# Altium footprint library MainFPs.PcbLib: 206 footprints (part 4 of 13)
Each footprint in its own frame and in the unit in brackets; x right, y up, seen from the top. Pads: shape width x height; smd on the part's side, far side on the other; paste and mask are expansions set on the pad; w line width, h text height; cw(c..) or ccw(c..) is an arc to the next point about the centre after c.
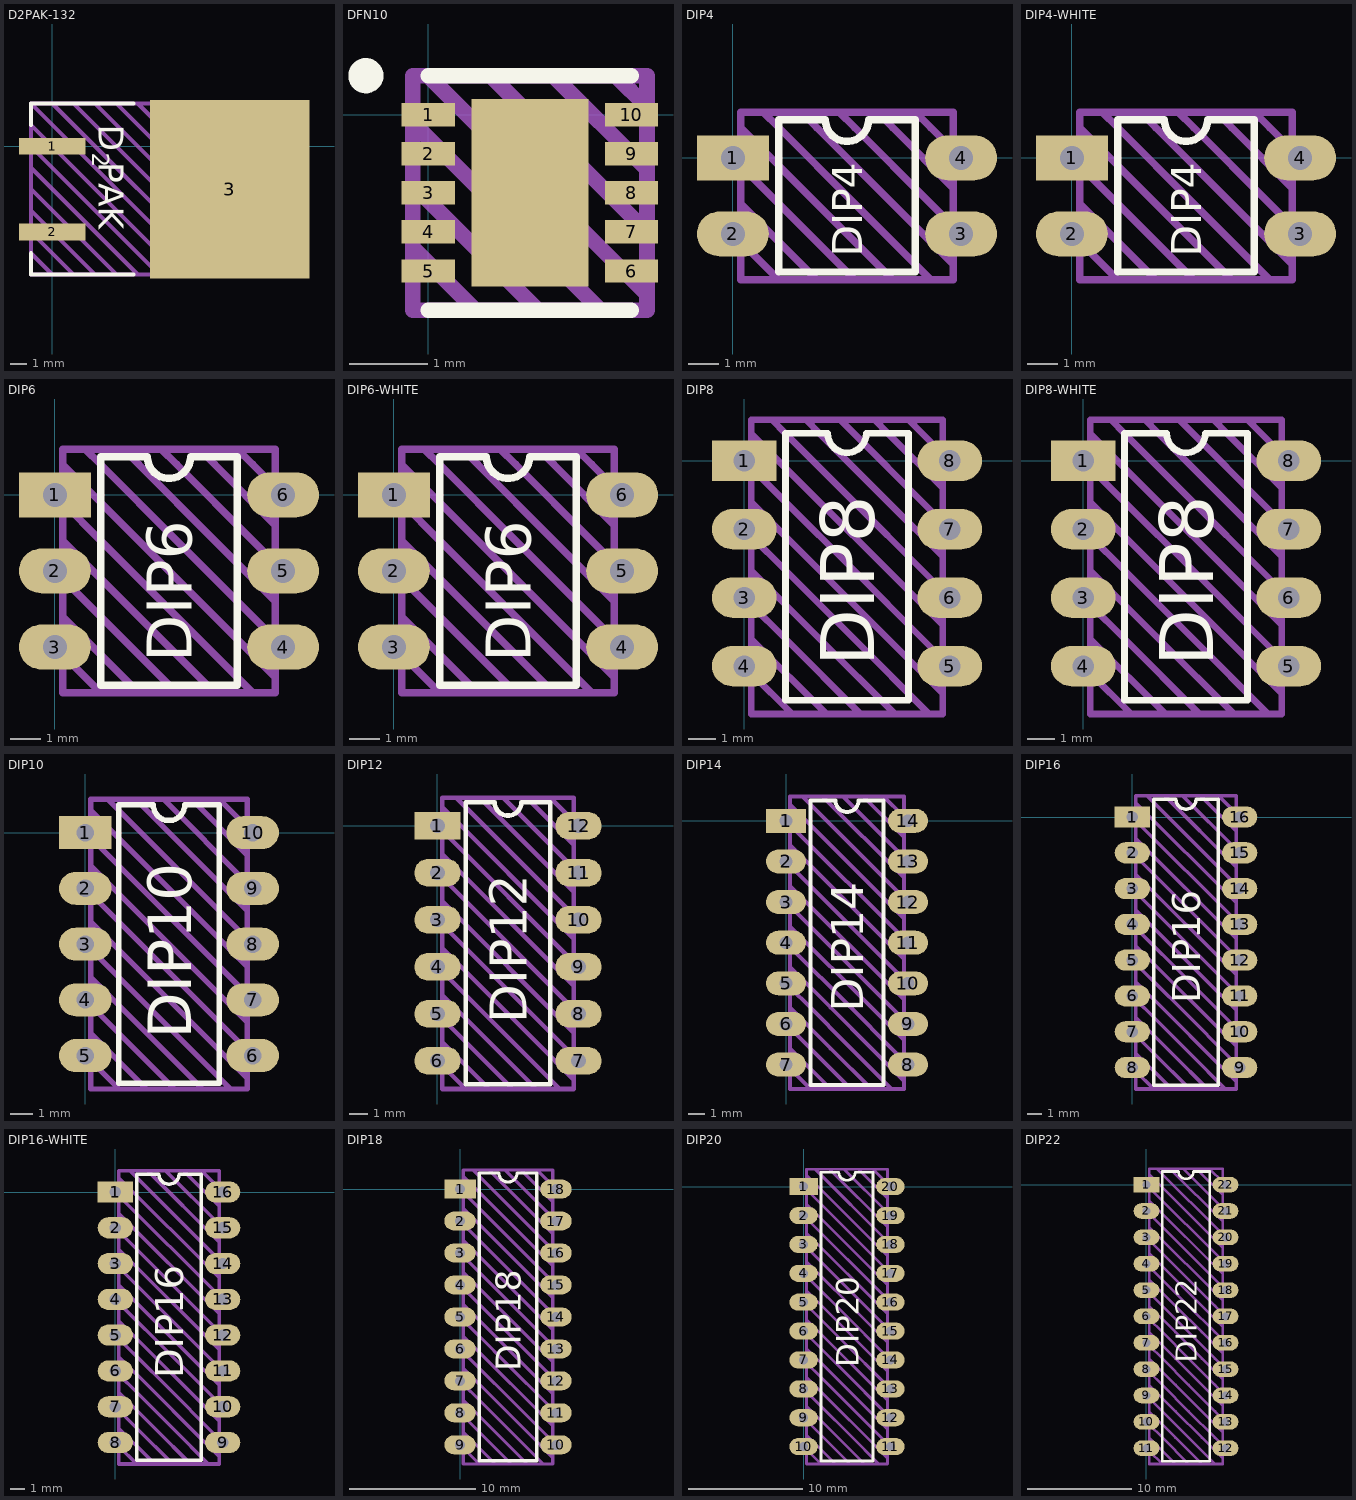
[diagram p3: the footprints below, top view; thin cyan lines are the x and y axes]

## D2PAK-132 [mm]
height 4.6
pads (3):
  rect 3.95x1 smd: 1(0,0) 2(0,-5.08)
  rect 9.5x10.6 smd: 3(10.541,-2.54)
Top Overlay:
  lines w0.25: -1.27,-6.35 -1.27,-7.62 4.826,-7.62 ; -1.27,1.27 -1.27,2.54 4.826,2.54
  text "D PAK" at 2.762,1.27 h1.5
  text "2" at 2.379,-0.383 h1
Draw:
  lines w0.25: -1.27,-6.35 0,-7.62 ; -1.27,-5.08 1.27,-7.62 ; -1.27,-3.81 2.54,-7.62 ; -1.27,-2.54 3.81,-7.62 ; -1.27,-1.27 5.08,-7.62 ; -1.27,0 6.35,-7.62 ; -1.27,1.27 7.62,-7.62 ; 0,2.54 10.16,-7.62 ; 1.27,2.54 11.43,-7.62 ; 2.54,2.54 12.7,-7.62 ; 3.81,2.54 13.97,-7.62 ; 5.08,2.54 14.097,-6.477 ; 6.35,2.54 14.097,-5.207 ; 7.62,2.54 14.097,-3.937 ; 8.89,-7.62 -1.27,2.54 ; 8.89,2.54 14.097,-2.667 ; 10.16,2.54 14.097,-1.397 ; 11.43,2.54 14.097,-0.127 ; 12.7,2.54 14.097,1.143 ; -1.27,2.54 -1.27,-7.62 14.097,-7.62 14.097,2.54 -1.27,2.54
Info:
  text "'.Comment'" at 1.297,-9.869 h1.25
3D body "D2PAK.step": height 4.7, standoff 0, extent -1.329,-7.69 14.096,2.61

## DFN10 [mm]
pads (11):
  rect 0.68x0.3 smd: 1(0,0) 2(0,-0.5) 3(0,-1) 4(0,-1.5) 5(0,-2) 6(2.6,-2) 7(2.6,-1.5) 8(2.6,-1) 9(2.6,-0.5) 10(2.6,0)
  rect 1.5x2.4 smd: ""(1.3,-1)
Top Overlay:
  circle w0.25: c-0.8,0.5 r0.1
  lines w0.2: 0,-2.5 2.6,-2.5 ; 0,0.5 2.6,0.5
Draw:
  lines w0.2: -0.2,-1.7 0.6,-2.5 ; -0.2,-0.9 1.4,-2.5 ; -0.2,-0.1 2.2,-2.5 ; 0,0.5 2.8,-2.3 ; 0.8,0.5 2.8,-1.5 ; 1.6,0.5 2.8,-0.7 ; 2.4,0.5 2.8,0.1 ; -0.2,-2.5 2.8,-2.5 2.8,0.5 -0.2,0.5 -0.2,-2.5
Info:
  text "'.Comment'" at -0.824,-3.292 h0.5
3D body "PSON50P300X100_HS-11N.step": height 1, standoff 0, extent -0.201,-2.5 2.801,0.5

## DIP4 [mm]
pads (4):
  rect 2.4x1.5 hole 0.8: 1(0,0)
  oval 2.4x1.5 hole 0.8: 2(0,-2.54) 3(7.62,-2.54) 4(7.62,0)
Top Overlay:
  lines w0.25: 3.048,1.27 1.524,1.27 1.524,-3.81 6.096,-3.81 6.096,1.27 4.572,1.27 ; 3.092,1.27 ccw(c3.81,1.27) 4.528,1.27
  text "DIP4" at 4.318,-3.302 h1
Draw:
  lines w0.25: 0.254,-2.794 1.524,-4.064 ; 0.254,-1.524 2.794,-4.064 ; 0.254,-0.254 1.524,-1.524 4.064,-4.064 ; 0.254,1.016 2.794,-1.524 5.334,-4.064 ; 3.556,1.524 4.064,1.016 6.604,-1.524 7.366,-2.286 ; 4.826,1.524 5.334,1.016 7.366,-1.016 ; 6.096,1.524 6.604,1.016 7.366,0.254 ; 6.604,-4.064 4.064,-1.524 1.524,1.016 1.016,1.524 2.286,1.524 2.794,1.016 5.334,-1.524 7.366,-3.556 ; 0.254,-4.064 0.254,1.524 7.366,1.524 7.366,-4.064 0.254,-4.064
Info:
  text "'.Comment'" at -0.381,-5.461 h1
3D body: height 2, standoff 0.25, extent 0.508,-3.81 7.112,1.27
3D body: height 3, standoff 2, extent 0.508,-3.81 7.112,1.27
3D body: height 2.09, standoff 0.31, extent -0.127,-0.5 0.508,0.5
3D body: height 0.38, standoff -3, extent -0.127,-0.254 0.127,0.254
3D body: height 2.09, standoff 0.31, extent -0.127,-3.04 0.508,-2.04
3D body: height 0.38, standoff -3, extent -0.127,-2.794 0.127,-2.286
3D body: height 2.09, standoff 0.31, extent 7.112,-3.04 7.747,-2.04
3D body: height 0.38, standoff -3, extent 7.493,-2.794 7.747,-2.286
3D body: height 2.09, standoff 0.31, extent 7.112,-0.5 7.747,0.5
3D body: height 0.38, standoff -3, extent 7.493,-0.254 7.747,0.254

## DIP4-WHITE [mm]
pads (4):
  rect 2.4x1.5 hole 0.8: 1(0,0)
  oval 2.4x1.5 hole 0.8: 2(0,-2.54) 3(7.62,-2.54) 4(7.62,0)
Top Overlay:
  lines w0.25: 3.048,1.27 1.524,1.27 1.524,-3.81 6.096,-3.81 6.096,1.27 4.572,1.27 ; 3.092,1.27 ccw(c3.81,1.27) 4.528,1.27
  text "DIP4" at 4.318,-3.302 h1
Draw:
  lines w0.25: 0.254,-2.794 1.524,-4.064 ; 0.254,-1.524 2.794,-4.064 ; 0.254,-0.254 1.524,-1.524 4.064,-4.064 ; 0.254,1.016 2.794,-1.524 5.334,-4.064 ; 3.556,1.524 4.064,1.016 6.604,-1.524 7.366,-2.286 ; 4.826,1.524 5.334,1.016 7.366,-1.016 ; 6.096,1.524 6.604,1.016 7.366,0.254 ; 6.604,-4.064 4.064,-1.524 1.524,1.016 1.016,1.524 2.286,1.524 2.794,1.016 5.334,-1.524 7.366,-3.556 ; 0.254,-4.064 7.366,-4.064 7.366,1.524 0.254,1.524 0.254,-4.064
Info:
  text "'.Comment'" at -0.381,-5.461 h1
3D body: height 0.38, standoff -3, extent 7.493,-0.254 7.747,0.254
3D body: height 2.09, standoff 0.31, extent 7.112,-0.5 7.747,0.5
3D body: height 0.38, standoff -3, extent 7.493,-2.794 7.747,-2.286
3D body: height 2.09, standoff 0.31, extent 7.112,-3.04 7.747,-2.04
3D body: height 0.38, standoff -3, extent -0.127,-2.794 0.127,-2.286
3D body: height 2.09, standoff 0.31, extent -0.127,-3.04 0.508,-2.04
3D body: height 0.38, standoff -3, extent -0.127,-0.254 0.127,0.254
3D body: height 2.09, standoff 0.31, extent -0.127,-0.5 0.508,0.5
3D body: height 3, standoff 2, extent 0.508,-3.81 7.112,1.27
3D body: height 2, standoff 0.25, extent 0.508,-3.81 7.112,1.27

## DIP6 [mm]
pads (6):
  rect 2.4x1.5 hole 0.8: 1(0,0)
  oval 2.4x1.5 hole 0.8: 2(0,-2.54) 3(0,-5.08) 4(7.62,-5.08) 5(7.62,-2.54) 6(7.62,0)
Top Overlay:
  lines w0.25: 3.048,1.27 1.524,1.27 1.524,-6.35 6.096,-6.35 6.096,1.27 4.572,1.27 ; 3.092,1.27 ccw(c3.81,1.27) 4.528,1.27
  text "DIP6" at 4.572,-5.588 h1.5
Draw:
  lines w0.25: 0.254,-5.334 1.524,-6.604 ; 0.254,-4.064 2.794,-6.604 ; 0.254,-2.794 1.524,-4.064 4.064,-6.604 ; 0.254,-1.524 2.794,-4.064 5.334,-6.604 ; 0.254,-0.254 1.524,-1.524 4.064,-4.064 6.604,-6.604 ; 0.254,1.016 2.794,-1.524 5.334,-4.064 7.366,-6.096 ; 3.556,1.524 4.064,1.016 6.604,-1.524 7.366,-2.286 ; 4.826,1.524 5.334,1.016 7.366,-1.016 ; 6.096,1.524 6.604,1.016 7.366,0.254 ; 7.366,-4.826 6.604,-4.064 4.064,-1.524 1.524,1.016 1.016,1.524 2.286,1.524 2.794,1.016 5.334,-1.524 7.366,-3.556 ; 0.254,-6.604 7.366,-6.604 7.366,1.524 0.254,1.524 0.254,-6.604
Info:
  text "'.Comment'" at -0.381,-8.001 h1
3D body: height 0.38, standoff -3, extent 7.493,-0.254 7.747,0.254
3D body: height 2.09, standoff 0.31, extent 7.112,-0.5 7.747,0.5
3D body: height 0.38, standoff -3, extent 7.493,-2.794 7.747,-2.286
3D body: height 2.09, standoff 0.31, extent 7.112,-3.04 7.747,-2.04
3D body: height 0.38, standoff -3, extent 7.493,-5.334 7.747,-4.826
3D body: height 2.09, standoff 0.31, extent 7.112,-5.58 7.747,-4.58
3D body: height 0.38, standoff -3, extent -0.127,-5.334 0.127,-4.826
3D body: height 2.09, standoff 0.31, extent -0.127,-5.58 0.508,-4.58
3D body: height 0.38, standoff -3, extent -0.127,-2.794 0.127,-2.286
3D body: height 2.09, standoff 0.31, extent -0.127,-3.04 0.508,-2.04
3D body: height 0.38, standoff -3, extent -0.127,-0.254 0.127,0.254
3D body: height 2.09, standoff 0.31, extent -0.127,-0.5 0.508,0.5
3D body: height 3, standoff 2, extent 0.508,-6.35 7.112,1.27
3D body: height 2, standoff 0.25, extent 0.508,-6.35 7.112,1.27

## DIP6-WHITE [mm]
pads (6):
  rect 2.4x1.5 hole 0.8: 1(0,0)
  oval 2.4x1.5 hole 0.8: 2(0,-2.54) 3(0,-5.08) 4(7.62,-5.08) 5(7.62,-2.54) 6(7.62,0)
Top Overlay:
  lines w0.25: 3.048,1.27 1.524,1.27 1.524,-6.35 6.096,-6.35 6.096,1.27 4.572,1.27 ; 3.092,1.27 ccw(c3.81,1.27) 4.528,1.27
  text "DIP6" at 4.572,-5.588 h1.5
Draw:
  lines w0.25: 0.254,-5.334 1.524,-6.604 ; 0.254,-4.064 2.794,-6.604 ; 0.254,-2.794 1.524,-4.064 4.064,-6.604 ; 0.254,-1.524 2.794,-4.064 5.334,-6.604 ; 0.254,-0.254 1.524,-1.524 4.064,-4.064 6.604,-6.604 ; 0.254,1.016 2.794,-1.524 5.334,-4.064 7.366,-6.096 ; 3.556,1.524 4.064,1.016 6.604,-1.524 7.366,-2.286 ; 4.826,1.524 5.334,1.016 7.366,-1.016 ; 6.096,1.524 6.604,1.016 7.366,0.254 ; 7.366,-4.826 6.604,-4.064 4.064,-1.524 1.524,1.016 1.016,1.524 2.286,1.524 2.794,1.016 5.334,-1.524 7.366,-3.556 ; 0.254,-6.604 7.366,-6.604 7.366,1.524 0.254,1.524 0.254,-6.604
Info:
  text "'.Comment'" at -0.381,-8.001 h1
3D body: height 0.38, standoff -3, extent 7.493,-0.254 7.747,0.254
3D body: height 2.09, standoff 0.31, extent 7.112,-0.5 7.747,0.5
3D body: height 0.38, standoff -3, extent 7.493,-2.794 7.747,-2.286
3D body: height 2.09, standoff 0.31, extent 7.112,-3.04 7.747,-2.04
3D body: height 0.38, standoff -3, extent 7.493,-5.334 7.747,-4.826
3D body: height 2.09, standoff 0.31, extent 7.112,-5.58 7.747,-4.58
3D body: height 0.38, standoff -3, extent -0.127,-5.334 0.127,-4.826
3D body: height 2.09, standoff 0.31, extent -0.127,-5.58 0.508,-4.58
3D body: height 0.38, standoff -3, extent -0.127,-2.794 0.127,-2.286
3D body: height 2.09, standoff 0.31, extent -0.127,-3.04 0.508,-2.04
3D body: height 0.38, standoff -3, extent -0.127,-0.254 0.127,0.254
3D body: height 2.09, standoff 0.31, extent -0.127,-0.5 0.508,0.5
3D body: height 3, standoff 2, extent 0.508,-6.35 7.112,1.27
3D body: height 2, standoff 0.25, extent 0.508,-6.35 7.112,1.27

## DIP8 [mm]
pads (8):
  rect 2.4x1.5 hole 0.8: 1(0,0)
  oval 2.4x1.5 hole 0.8: 2(0,-2.54) 3(0,-5.08) 4(0,-7.62) 5(7.62,-7.62) 6(7.62,-5.08) 7(7.62,-2.54) 8(7.62,0)
Top Overlay:
  lines w0.25: 3.048,1.016 1.524,1.016 1.524,-8.89 6.096,-8.89 6.096,1.016 4.572,1.016 ; 3.092,1.016 ccw(c3.81,1.016) 4.528,1.016
  text "DIP8" at 4.826,-7.62 h2
Draw:
  lines w0.25: 0.254,-7.874 1.778,-9.398 ; 0.254,-6.604 3.048,-9.398 ; 0.254,-5.334 1.524,-6.604 4.318,-9.398 ; 0.254,-4.064 2.794,-6.604 5.588,-9.398 ; 0.254,-2.794 1.524,-4.064 4.064,-6.604 6.858,-9.398 ; 0.254,-1.524 2.794,-4.064 5.334,-6.604 7.366,-8.636 ; 0.254,-0.254 1.524,-1.524 4.064,-4.064 6.604,-6.604 7.366,-7.366 ; 0.254,1.016 2.794,-1.524 5.334,-4.064 7.366,-6.096 ; 1.016,1.524 1.524,1.016 4.064,-1.524 6.604,-4.064 7.366,-4.826 ; 2.286,1.524 2.794,1.016 5.334,-1.524 7.366,-3.556 ; 3.556,1.524 4.064,1.016 6.604,-1.524 7.366,-2.286 ; 4.826,1.524 5.334,1.016 7.366,-1.016 ; 6.096,1.524 6.604,1.016 7.366,0.254 ; 0.254,-9.398 0.254,1.524 7.366,1.524 7.366,-9.398 0.254,-9.398
Info:
  text "'.Comment'" at -0.381,-10.795 h1
3D body: height 2.03, standoff 0.25, extent 0.508,-8.89 7.112,1.27
3D body: height 3, standoff 2, extent 0.508,-8.89 7.112,1.27
3D body: height 0.38, standoff -3, extent 7.493,-0.254 7.747,0.254
3D body: height 2.09, standoff 0.31, extent 7.112,-0.5 7.747,0.5
3D body: height 0.38, standoff -3, extent 7.493,-2.794 7.747,-2.286
3D body: height 2.09, standoff 0.31, extent 7.112,-3.04 7.747,-2.04
3D body: height 0.38, standoff -3, extent -0.127,-2.794 0.127,-2.286
3D body: height 2.09, standoff 0.31, extent -0.127,-3.04 0.508,-2.04
3D body: height 0.38, standoff -3, extent -0.127,-0.254 0.127,0.254
3D body: height 2.09, standoff 0.31, extent -0.127,-0.5 0.508,0.5
3D body: height 0.38, standoff -3, extent 7.493,-5.334 7.747,-4.826
3D body: height 2.09, standoff 0.31, extent 7.112,-5.58 7.747,-4.58
3D body: height 0.38, standoff -3, extent 7.493,-7.874 7.747,-7.366
3D body: height 2.09, standoff 0.31, extent 7.112,-8.12 7.747,-7.12
3D body: height 0.38, standoff -3, extent -0.127,-7.874 0.127,-7.366
3D body: height 2.09, standoff 0.31, extent -0.127,-8.12 0.508,-7.12
3D body: height 0.38, standoff -3, extent -0.127,-5.334 0.127,-4.826
3D body: height 2.09, standoff 0.31, extent -0.127,-5.58 0.508,-4.58

## DIP8-WHITE [mm]
pads (8):
  rect 2.4x1.5 hole 0.8: 1(0,0)
  oval 2.4x1.5 hole 0.8: 2(0,-2.54) 3(0,-5.08) 4(0,-7.62) 5(7.62,-7.62) 6(7.62,-5.08) 7(7.62,-2.54) 8(7.62,0)
Top Overlay:
  lines w0.25: 3.048,1.016 1.524,1.016 1.524,-8.89 6.096,-8.89 6.096,1.016 4.572,1.016 ; 3.092,1.016 ccw(c3.81,1.016) 4.528,1.016
  text "DIP8" at 4.826,-7.62 h2
Draw:
  lines w0.25: 0.254,-7.874 1.778,-9.398 ; 0.254,-6.604 3.048,-9.398 ; 0.254,-5.334 1.524,-6.604 4.318,-9.398 ; 0.254,-4.064 2.794,-6.604 5.588,-9.398 ; 0.254,-2.794 1.524,-4.064 4.064,-6.604 6.858,-9.398 ; 0.254,-1.524 2.794,-4.064 5.334,-6.604 7.366,-8.636 ; 0.254,-0.254 1.524,-1.524 4.064,-4.064 6.604,-6.604 7.366,-7.366 ; 0.254,1.016 2.794,-1.524 5.334,-4.064 7.366,-6.096 ; 1.016,1.524 1.524,1.016 4.064,-1.524 6.604,-4.064 7.366,-4.826 ; 2.286,1.524 2.794,1.016 5.334,-1.524 7.366,-3.556 ; 3.556,1.524 4.064,1.016 6.604,-1.524 7.366,-2.286 ; 4.826,1.524 5.334,1.016 7.366,-1.016 ; 6.096,1.524 6.604,1.016 7.366,0.254 ; 0.254,-9.398 0.254,1.524 7.366,1.524 7.366,-9.398 0.254,-9.398
Info:
  text "'.Comment'" at -0.381,-10.795 h1
3D body: height 2.03, standoff 0.25, extent 0.508,-8.89 7.112,1.27
3D body: height 3, standoff 2, extent 0.508,-8.89 7.112,1.27
3D body: height 0.38, standoff -3, extent 7.493,-0.254 7.747,0.254
3D body: height 2.09, standoff 0.31, extent 7.112,-0.5 7.747,0.5
3D body: height 0.38, standoff -3, extent 7.493,-2.794 7.747,-2.286
3D body: height 2.09, standoff 0.31, extent 7.112,-3.04 7.747,-2.04
3D body: height 0.38, standoff -3, extent -0.127,-2.794 0.127,-2.286
3D body: height 2.09, standoff 0.31, extent -0.127,-3.04 0.508,-2.04
3D body: height 0.38, standoff -3, extent -0.127,-0.254 0.127,0.254
3D body: height 2.09, standoff 0.31, extent -0.127,-0.5 0.508,0.5
3D body: height 0.38, standoff -3, extent 7.493,-5.334 7.747,-4.826
3D body: height 2.09, standoff 0.31, extent 7.112,-5.58 7.747,-4.58
3D body: height 0.38, standoff -3, extent 7.493,-7.874 7.747,-7.366
3D body: height 2.09, standoff 0.31, extent 7.112,-8.12 7.747,-7.12
3D body: height 0.38, standoff -3, extent -0.127,-7.874 0.127,-7.366
3D body: height 2.09, standoff 0.31, extent -0.127,-8.12 0.508,-7.12
3D body: height 0.38, standoff -3, extent -0.127,-5.334 0.127,-4.826
3D body: height 2.09, standoff 0.31, extent -0.127,-5.58 0.508,-4.58

## DIP10 [mm]
pads (10):
  rect 2.4x1.5 hole 0.8: 1(0,0)
  oval 2.4x1.5 hole 0.8: 2(0,-2.54) 3(0,-5.08) 4(0,-7.62) 5(0,-10.16) 6(7.62,-10.16) 7(7.62,-7.62) 8(7.62,-5.08) 9(7.62,-2.54) 10(7.62,0)
Top Overlay:
  lines w0.25: 3.048,1.27 1.524,1.27 1.524,-11.43 6.096,-11.43 6.096,1.27 4.572,1.27 ; 3.092,1.27 ccw(c3.81,1.27) 4.528,1.27
  text "DIP10" at 4.826,-9.398 h2
Draw:
  lines w0.25: 0.254,-10.414 1.524,-11.684 ; 0.254,-9.144 2.794,-11.684 ; 0.254,-7.874 4.064,-11.684 ; 0.254,-6.604 5.334,-11.684 ; 0.254,-5.334 6.604,-11.684 ; 0.254,-4.064 7.366,-11.176 ; 0.254,-2.794 7.366,-9.906 ; 0.254,-1.524 7.366,-8.636 7.366,-7.366 0.254,-0.254 0.254,1.016 7.366,-6.096 7.366,-4.826 1.016,1.524 2.286,1.524 7.366,-3.556 7.366,-2.286 3.556,1.524 4.826,1.524 7.366,-1.016 7.366,0.254 6.096,1.524 ; 0.254,-11.684 7.366,-11.684 7.366,1.524 0.254,1.524 0.254,-11.684
Info:
  text "'.Comment'" at -0.381,-13.081 h1
3D body: height 2.09, standoff 0.31, extent -0.127,-10.66 0.508,-9.66
3D body: height 0.38, standoff -3, extent -0.127,-10.414 0.127,-9.906
3D body: height 2.09, standoff 0.31, extent 7.112,-10.66 7.747,-9.66
3D body: height 0.38, standoff -3, extent 7.493,-10.414 7.747,-9.906
3D body: height 2.09, standoff 0.31, extent -0.127,-5.58 0.508,-4.58
3D body: height 0.38, standoff -3, extent -0.127,-5.334 0.127,-4.826
3D body: height 2.09, standoff 0.31, extent -0.127,-8.12 0.508,-7.12
3D body: height 0.38, standoff -3, extent -0.127,-7.874 0.127,-7.366
3D body: height 2.09, standoff 0.31, extent 7.112,-8.12 7.747,-7.12
3D body: height 0.38, standoff -3, extent 7.493,-7.874 7.747,-7.366
3D body: height 2.09, standoff 0.31, extent 7.112,-5.58 7.747,-4.58
3D body: height 0.38, standoff -3, extent 7.493,-5.334 7.747,-4.826
3D body: height 2.09, standoff 0.31, extent -0.127,-0.5 0.508,0.5
3D body: height 0.38, standoff -3, extent -0.127,-0.254 0.127,0.254
3D body: height 2.09, standoff 0.31, extent -0.127,-3.04 0.508,-2.04
3D body: height 0.38, standoff -3, extent -0.127,-2.794 0.127,-2.286
3D body: height 2.09, standoff 0.31, extent 7.112,-3.04 7.747,-2.04
3D body: height 0.38, standoff -3, extent 7.493,-2.794 7.747,-2.286
3D body: height 2.09, standoff 0.31, extent 7.112,-0.5 7.747,0.5
3D body: height 0.38, standoff -3, extent 7.493,-0.254 7.747,0.254
3D body: height 3, standoff 2, extent 0.508,-11.43 7.112,1.27
3D body: height 2.03, standoff 0.25, extent 0.508,-11.43 7.112,1.27

## DIP12 [mm]
pads (12):
  rect 2.5x1.5 hole 0.8: 1(0,0)
  oval 2.5x1.5 hole 0.8: 2(0,-2.54) 3(0,-5.08) 4(0,-7.62) 5(0,-10.16) 6(0,-12.7) 7(7.62,-12.7) 8(7.62,-10.16) 9(7.62,-7.62) 10(7.62,-5.08) 11(7.62,-2.54) 12(7.62,0)
Top Overlay:
  lines w0.25: 3.048,1.27 1.524,1.27 1.524,-13.97 6.096,-13.97 6.096,1.27 4.572,1.27 ; 3.092,1.27 ccw(c3.81,1.27) 4.528,1.27
  text "DIP12" at 4.826,-10.668 h2
Draw:
  lines w0.25: 0.254,-12.954 1.524,-14.224 ; 0.254,-11.684 2.794,-14.224 4.064,-14.224 ; 0.254,-10.414 1.524,-11.684 ; 0.254,-9.144 2.794,-11.684 ; 0.254,-7.874 4.064,-11.684 6.604,-14.224 5.334,-14.224 ; 0.254,-6.604 5.334,-11.684 7.366,-13.716 ; 0.254,-5.334 6.604,-11.684 7.366,-12.446 ; 0.254,-4.064 7.366,-11.176 ; 0.254,-2.794 7.366,-9.906 ; 0.254,-1.524 7.366,-8.636 ; 0.254,-0.254 7.366,-7.366 ; 0.254,1.016 7.366,-6.096 ; 1.016,1.524 7.366,-4.826 ; 2.286,1.524 7.366,-3.556 ; 3.556,1.524 7.366,-2.286 ; 4.826,1.524 7.366,-1.016 ; 6.096,1.524 7.366,0.254 ; 2.794,-11.684 5.334,-14.224 ; 2.794,-11.684 5.334,-14.224 ; 4.064,-14.224 1.27,-11.43 4.064,-14.224 ; 4.064,-14.224 5.334,-14.224 ; 0.254,-14.224 7.366,-14.224 7.366,1.524 0.254,1.524 0.254,-14.224
Info:
  text "'.Comment'" at -0.381,-15.621 h1
3D body: height 2.09, standoff 0.31, extent -0.127,-10.66 0.508,-9.66
3D body: height 0.38, standoff -3, extent -0.127,-10.414 0.127,-9.906
3D body: height 2.09, standoff 0.31, extent -0.127,-13.2 0.508,-12.2
3D body: height 0.38, standoff -3, extent -0.127,-12.954 0.127,-12.446
3D body: height 2.09, standoff 0.31, extent 7.112,-13.2 7.747,-12.2
3D body: height 0.38, standoff -3, extent 7.493,-12.954 7.747,-12.446
3D body: height 2.09, standoff 0.31, extent 7.112,-10.66 7.747,-9.66
3D body: height 0.38, standoff -3, extent 7.493,-10.414 7.747,-9.906
3D body: height 2.09, standoff 0.31, extent -0.127,-5.58 0.508,-4.58
3D body: height 0.38, standoff -3, extent -0.127,-5.334 0.127,-4.826
3D body: height 2.09, standoff 0.31, extent -0.127,-8.12 0.508,-7.12
3D body: height 0.38, standoff -3, extent -0.127,-7.874 0.127,-7.366
3D body: height 2.09, standoff 0.31, extent 7.112,-8.12 7.747,-7.12
3D body: height 0.38, standoff -3, extent 7.493,-7.874 7.747,-7.366
3D body: height 2.09, standoff 0.31, extent 7.112,-5.58 7.747,-4.58
3D body: height 0.38, standoff -3, extent 7.493,-5.334 7.747,-4.826
3D body: height 2.09, standoff 0.31, extent -0.127,-0.5 0.508,0.5
3D body: height 0.38, standoff -3, extent -0.127,-0.254 0.127,0.254
3D body: height 2.09, standoff 0.31, extent -0.127,-3.04 0.508,-2.04
3D body: height 0.38, standoff -3, extent -0.127,-2.794 0.127,-2.286
3D body: height 2.09, standoff 0.31, extent 7.112,-3.04 7.747,-2.04
3D body: height 0.38, standoff -3, extent 7.493,-2.794 7.747,-2.286
3D body: height 2.09, standoff 0.31, extent 7.112,-0.5 7.747,0.5
3D body: height 0.38, standoff -3, extent 7.493,-0.254 7.747,0.254
3D body: height 3, standoff 2, extent 0.508,-13.97 7.112,1.27
3D body: height 2.03, standoff 0.25, extent 0.508,-13.97 7.112,1.27

## DIP14 [mm]
pads (14):
  rect 2.5x1.5 hole 0.8: 1(0,0)
  oval 2.5x1.5 hole 0.8: 2(0,-2.54) 3(0,-5.08) 4(0,-7.62) 5(0,-10.16) 6(0,-12.7) 7(0,-15.24) 8(7.62,-15.24) 9(7.62,-12.7) 10(7.62,-10.16) 11(7.62,-7.62) 12(7.62,-5.08) 13(7.62,-2.54) 14(7.62,0)
Top Overlay:
  lines w0.25: 3.048,1.27 1.524,1.27 1.524,-16.51 6.096,-16.51 6.096,1.27 4.572,1.27 ; 3.092,1.27 ccw(c3.81,1.27) 4.528,1.27
  text "DIP14" at 4.826,-11.938 h2
Draw:
  lines w0.25: 0.254,-15.494 1.524,-16.764 ; 0.254,-14.224 2.794,-16.764 ; 0.254,-12.954 1.524,-14.224 4.064,-16.764 ; 0.254,-11.684 2.794,-14.224 5.334,-16.764 ; 0.254,-10.414 1.524,-11.684 ; 0.254,-9.144 2.794,-11.684 ; 0.254,-7.874 4.064,-11.684 6.604,-14.224 7.366,-14.986 ; 0.254,-6.604 5.334,-11.684 7.366,-13.716 ; 0.254,-5.334 6.604,-11.684 7.366,-12.446 ; 0.254,-4.064 7.366,-11.176 ; 0.254,-2.794 7.366,-9.906 ; 0.254,-1.524 7.366,-8.636 ; 0.254,-0.254 7.366,-7.366 ; 0.254,1.016 7.366,-6.096 ; 1.016,1.524 7.366,-4.826 ; 2.286,1.524 7.366,-3.556 ; 3.556,1.524 7.366,-2.286 ; 4.826,1.524 7.366,-1.016 ; 6.096,1.524 7.366,0.254 ; 6.604,-16.764 4.064,-14.224 ; 7.366,-16.256 5.334,-14.224 ; 2.794,-11.684 5.334,-14.224 ; 2.794,-11.684 5.334,-14.224 ; 4.064,-14.224 1.27,-11.43 4.064,-14.224 ; 0.254,-16.764 0.254,1.524 7.366,1.524 7.366,-16.764 0.254,-16.764
Info:
  text "'.Comment'" at -0.381,-18.161 h1
3D body: height 2.03, standoff 0.25, extent 0.508,-16.51 7.112,1.27
3D body: height 3, standoff 2, extent 0.508,-16.51 7.112,1.27
3D body: height 0.38, standoff -3, extent 7.493,-0.254 7.747,0.254
3D body: height 2.09, standoff 0.31, extent 7.112,-0.5 7.747,0.5
3D body: height 0.38, standoff -3, extent 7.493,-2.794 7.747,-2.286
3D body: height 2.09, standoff 0.31, extent 7.112,-3.04 7.747,-2.04
3D body: height 0.38, standoff -3, extent -0.127,-2.794 0.127,-2.286
3D body: height 2.09, standoff 0.31, extent -0.127,-3.04 0.508,-2.04
3D body: height 0.38, standoff -3, extent -0.127,-0.254 0.127,0.254
3D body: height 2.09, standoff 0.31, extent -0.127,-0.5 0.508,0.5
3D body: height 0.38, standoff -3, extent 7.493,-5.334 7.747,-4.826
3D body: height 2.09, standoff 0.31, extent 7.112,-5.58 7.747,-4.58
3D body: height 0.38, standoff -3, extent 7.493,-7.874 7.747,-7.366
3D body: height 2.09, standoff 0.31, extent 7.112,-8.12 7.747,-7.12
3D body: height 0.38, standoff -3, extent -0.127,-7.874 0.127,-7.366
3D body: height 2.09, standoff 0.31, extent -0.127,-8.12 0.508,-7.12
3D body: height 0.38, standoff -3, extent -0.127,-5.334 0.127,-4.826
3D body: height 2.09, standoff 0.31, extent -0.127,-5.58 0.508,-4.58
3D body: height 0.38, standoff -3, extent 7.493,-10.414 7.747,-9.906
3D body: height 2.09, standoff 0.31, extent 7.112,-10.66 7.747,-9.66
3D body: height 0.38, standoff -3, extent 7.493,-12.954 7.747,-12.446
3D body: height 2.09, standoff 0.31, extent 7.112,-13.2 7.747,-12.2
3D body: height 0.38, standoff -3, extent -0.127,-12.954 0.127,-12.446
3D body: height 2.09, standoff 0.31, extent -0.127,-13.2 0.508,-12.2
3D body: height 0.38, standoff -3, extent -0.127,-10.414 0.127,-9.906
3D body: height 2.09, standoff 0.31, extent -0.127,-10.66 0.508,-9.66
3D body: height 0.38, standoff -3, extent 7.493,-15.494 7.747,-14.986
3D body: height 2.09, standoff 0.31, extent 7.112,-15.74 7.747,-14.74
3D body: height 0.38, standoff -3, extent -0.127,-15.494 0.127,-14.986
3D body: height 2.09, standoff 0.31, extent -0.127,-15.74 0.508,-14.74

## DIP16 [mm]
pads (16):
  rect 2.5x1.5 hole 0.8: 1(0,0)
  oval 2.5x1.5 hole 0.8: 2(0,-2.54) 3(0,-5.08) 4(0,-7.62) 5(0,-10.16) 6(0,-12.7) 7(0,-15.24) 8(0,-17.78) 9(7.62,-17.78) 10(7.62,-15.24) 11(7.62,-12.7) 12(7.62,-10.16) 13(7.62,-7.62) 14(7.62,-5.08) 15(7.62,-2.54) 16(7.62,0)
Top Overlay:
  lines w0.25: 3.048,1.27 1.524,1.27 1.524,-19.05 6.096,-19.05 6.096,1.27 5.588,1.27 4.572,1.27 ; 3.092,1.27 ccw(c3.81,1.27) 4.528,1.27
  text "DIP16" at 4.826,-13.208 h2
Draw:
  lines w0.25: 0.254,-18.034 1.524,-19.304 ; 0.254,-16.764 2.794,-19.304 ; 0.254,-15.494 1.524,-16.764 4.064,-19.304 ; 0.254,-14.224 2.794,-16.764 5.334,-19.304 ; 0.254,-12.954 1.524,-14.224 4.064,-16.764 6.604,-19.304 ; 0.254,-11.684 2.794,-14.224 5.334,-16.764 7.366,-18.796 ; 0.254,-10.414 1.524,-11.684 ; 0.254,-9.144 2.794,-11.684 ; 0.254,-7.874 4.064,-11.684 6.604,-14.224 7.366,-14.986 ; 0.254,-6.604 5.334,-11.684 7.366,-13.716 ; 0.254,-5.334 6.604,-11.684 7.366,-12.446 ; 0.254,-4.064 7.366,-11.176 ; 0.254,-2.794 7.366,-9.906 ; 0.254,-1.524 7.366,-8.636 ; 0.254,-0.254 7.366,-7.366 ; 0.254,1.016 7.366,-6.096 ; 1.016,1.524 7.366,-4.826 ; 2.286,1.524 7.366,-3.556 ; 3.556,1.524 7.366,-2.286 ; 4.826,1.524 7.366,-1.016 ; 6.096,1.524 7.366,0.254 ; 7.366,-17.526 6.604,-16.764 4.064,-14.224 ; 7.366,-16.256 5.334,-14.224 ; 2.794,-11.684 5.334,-14.224 ; 2.794,-11.684 5.334,-14.224 ; 4.064,-14.224 1.27,-11.43 4.064,-14.224 ; 0.254,-19.304 7.366,-19.304 7.366,1.524 0.254,1.524 0.254,-19.304
Info:
  text "'.Comment'" at -0.381,-20.701 h1
3D body: height 2.09, standoff 0.31, extent -0.127,-15.74 0.508,-14.74
3D body: height 0.38, standoff -3, extent -0.127,-15.494 0.127,-14.986
3D body: height 2.09, standoff 0.31, extent -0.127,-18.28 0.508,-17.28
3D body: height 0.38, standoff -3, extent -0.127,-18.034 0.127,-17.526
3D body: height 2.09, standoff 0.31, extent 7.112,-18.28 7.747,-17.28
3D body: height 0.38, standoff -3, extent 7.493,-18.034 7.747,-17.526
3D body: height 2.09, standoff 0.31, extent 7.112,-15.74 7.747,-14.74
3D body: height 0.38, standoff -3, extent 7.493,-15.494 7.747,-14.986
3D body: height 2.09, standoff 0.31, extent -0.127,-10.66 0.508,-9.66
3D body: height 0.38, standoff -3, extent -0.127,-10.414 0.127,-9.906
3D body: height 2.09, standoff 0.31, extent -0.127,-13.2 0.508,-12.2
3D body: height 0.38, standoff -3, extent -0.127,-12.954 0.127,-12.446
3D body: height 2.09, standoff 0.31, extent 7.112,-13.2 7.747,-12.2
3D body: height 0.38, standoff -3, extent 7.493,-12.954 7.747,-12.446
3D body: height 2.09, standoff 0.31, extent 7.112,-10.66 7.747,-9.66
3D body: height 0.38, standoff -3, extent 7.493,-10.414 7.747,-9.906
3D body: height 2.09, standoff 0.31, extent -0.127,-5.58 0.508,-4.58
3D body: height 0.38, standoff -3, extent -0.127,-5.334 0.127,-4.826
3D body: height 2.09, standoff 0.31, extent -0.127,-8.12 0.508,-7.12
3D body: height 0.38, standoff -3, extent -0.127,-7.874 0.127,-7.366
3D body: height 2.09, standoff 0.31, extent 7.112,-8.12 7.747,-7.12
3D body: height 0.38, standoff -3, extent 7.493,-7.874 7.747,-7.366
3D body: height 2.09, standoff 0.31, extent 7.112,-5.58 7.747,-4.58
3D body: height 0.38, standoff -3, extent 7.493,-5.334 7.747,-4.826
3D body: height 2.09, standoff 0.31, extent -0.127,-0.5 0.508,0.5
3D body: height 0.38, standoff -3, extent -0.127,-0.254 0.127,0.254
3D body: height 2.09, standoff 0.31, extent -0.127,-3.04 0.508,-2.04
3D body: height 0.38, standoff -3, extent -0.127,-2.794 0.127,-2.286
3D body: height 2.09, standoff 0.31, extent 7.112,-3.04 7.747,-2.04
3D body: height 0.38, standoff -3, extent 7.493,-2.794 7.747,-2.286
3D body: height 2.09, standoff 0.31, extent 7.112,-0.5 7.747,0.5
3D body: height 0.38, standoff -3, extent 7.493,-0.254 7.747,0.254
3D body: height 2.03, standoff 0.25, extent 0.508,-19.05 7.112,1.27
3D body: height 3, standoff 2, extent 0.508,-19.05 7.112,1.27

## DIP16-WHITE [mm]
pads (16):
  rect 2.5x1.5 hole 0.8: 1(0,0)
  oval 2.5x1.5 hole 0.8: 2(0,-2.54) 3(0,-5.08) 4(0,-7.62) 5(0,-10.16) 6(0,-12.7) 7(0,-15.24) 8(0,-17.78) 9(7.62,-17.78) 10(7.62,-15.24) 11(7.62,-12.7) 12(7.62,-10.16) 13(7.62,-7.62) 14(7.62,-5.08) 15(7.62,-2.54) 16(7.62,0)
Top Overlay:
  lines w0.25: 3.048,1.27 1.524,1.27 1.524,-19.05 6.096,-19.05 6.096,1.27 5.588,1.27 4.572,1.27 ; 3.092,1.27 ccw(c3.81,1.27) 4.528,1.27
  text "DIP16" at 4.826,-13.208 h2
Draw:
  lines w0.25: 0.254,-18.034 1.524,-19.304 ; 0.254,-16.764 2.794,-19.304 ; 0.254,-15.494 1.524,-16.764 4.064,-19.304 ; 0.254,-14.224 2.794,-16.764 5.334,-19.304 ; 0.254,-12.954 1.524,-14.224 4.064,-16.764 6.604,-19.304 ; 0.254,-11.684 2.794,-14.224 5.334,-16.764 7.366,-18.796 ; 0.254,-10.414 1.524,-11.684 ; 0.254,-9.144 2.794,-11.684 ; 0.254,-7.874 4.064,-11.684 6.604,-14.224 7.366,-14.986 ; 0.254,-6.604 5.334,-11.684 7.366,-13.716 ; 0.254,-5.334 6.604,-11.684 7.366,-12.446 ; 0.254,-4.064 7.366,-11.176 ; 0.254,-2.794 7.366,-9.906 ; 0.254,-1.524 7.366,-8.636 ; 0.254,-0.254 7.366,-7.366 ; 0.254,1.016 7.366,-6.096 ; 1.016,1.524 7.366,-4.826 ; 2.286,1.524 7.366,-3.556 ; 3.556,1.524 7.366,-2.286 ; 4.826,1.524 7.366,-1.016 ; 6.096,1.524 7.366,0.254 ; 7.366,-17.526 6.604,-16.764 4.064,-14.224 ; 7.366,-16.256 5.334,-14.224 ; 2.794,-11.684 5.334,-14.224 ; 2.794,-11.684 5.334,-14.224 ; 4.064,-14.224 1.27,-11.43 4.064,-14.224 ; 0.254,-19.304 0.254,1.524 7.366,1.524 7.366,-19.304 0.254,-19.304
Info:
  text "'.Comment'" at -0.381,-20.701 h1
3D body: height 3, standoff 2, extent 0.508,-19.05 7.112,1.27
3D body: height 2.03, standoff 0.25, extent 0.508,-19.05 7.112,1.27
3D body: height 0.38, standoff -3, extent 7.493,-0.254 7.747,0.254
3D body: height 2.09, standoff 0.31, extent 7.112,-0.5 7.747,0.5
3D body: height 0.38, standoff -3, extent 7.493,-2.794 7.747,-2.286
3D body: height 2.09, standoff 0.31, extent 7.112,-3.04 7.747,-2.04
3D body: height 0.38, standoff -3, extent -0.127,-2.794 0.127,-2.286
3D body: height 2.09, standoff 0.31, extent -0.127,-3.04 0.508,-2.04
3D body: height 0.38, standoff -3, extent -0.127,-0.254 0.127,0.254
3D body: height 2.09, standoff 0.31, extent -0.127,-0.5 0.508,0.5
3D body: height 0.38, standoff -3, extent 7.493,-5.334 7.747,-4.826
3D body: height 2.09, standoff 0.31, extent 7.112,-5.58 7.747,-4.58
3D body: height 0.38, standoff -3, extent 7.493,-7.874 7.747,-7.366
3D body: height 2.09, standoff 0.31, extent 7.112,-8.12 7.747,-7.12
3D body: height 0.38, standoff -3, extent -0.127,-7.874 0.127,-7.366
3D body: height 2.09, standoff 0.31, extent -0.127,-8.12 0.508,-7.12
3D body: height 0.38, standoff -3, extent -0.127,-5.334 0.127,-4.826
3D body: height 2.09, standoff 0.31, extent -0.127,-5.58 0.508,-4.58
3D body: height 0.38, standoff -3, extent 7.493,-10.414 7.747,-9.906
3D body: height 2.09, standoff 0.31, extent 7.112,-10.66 7.747,-9.66
3D body: height 0.38, standoff -3, extent 7.493,-12.954 7.747,-12.446
3D body: height 2.09, standoff 0.31, extent 7.112,-13.2 7.747,-12.2
3D body: height 0.38, standoff -3, extent -0.127,-12.954 0.127,-12.446
3D body: height 2.09, standoff 0.31, extent -0.127,-13.2 0.508,-12.2
3D body: height 0.38, standoff -3, extent -0.127,-10.414 0.127,-9.906
3D body: height 2.09, standoff 0.31, extent -0.127,-10.66 0.508,-9.66
3D body: height 0.38, standoff -3, extent 7.493,-15.494 7.747,-14.986
3D body: height 2.09, standoff 0.31, extent 7.112,-15.74 7.747,-14.74
3D body: height 0.38, standoff -3, extent 7.493,-18.034 7.747,-17.526
3D body: height 2.09, standoff 0.31, extent 7.112,-18.28 7.747,-17.28
3D body: height 0.38, standoff -3, extent -0.127,-18.034 0.127,-17.526
3D body: height 2.09, standoff 0.31, extent -0.127,-18.28 0.508,-17.28
3D body: height 0.38, standoff -3, extent -0.127,-15.494 0.127,-14.986
3D body: height 2.09, standoff 0.31, extent -0.127,-15.74 0.508,-14.74

## DIP18 [mm]
pads (18):
  rect 2.5x1.5 hole 0.8: 1(0,0)
  oval 2.5x1.5 hole 0.8: 2(0,-2.54) 3(0,-5.08) 4(0,-7.62) 5(0,-10.16) 6(0,-12.7) 7(0,-15.24) 8(0,-17.78) 9(0,-20.32) 10(7.62,-20.32) 11(7.62,-17.78) 12(7.62,-15.24) 13(7.62,-12.7) 14(7.62,-10.16) 15(7.62,-7.62) 16(7.62,-5.08) 17(7.62,-2.54) 18(7.62,0)
Top Overlay:
  lines w0.25: 3.048,1.27 1.524,1.27 1.524,-21.59 6.096,-21.59 6.096,1.27 4.572,1.27 ; 3.092,1.27 ccw(c3.81,1.27) 4.528,1.27
  text "DIP18" at 4.826,-14.478 h2
Draw:
  lines w0.25: 0.254,-20.574 1.524,-21.844 ; 0.254,-19.304 2.794,-21.844 ; 0.254,-18.034 1.524,-19.304 4.064,-21.844 ; 0.254,-16.764 2.794,-19.304 5.334,-21.844 ; 0.254,-15.494 1.524,-16.764 4.064,-19.304 6.604,-21.844 ; 0.254,-14.224 2.794,-16.764 5.334,-19.304 7.366,-21.336 ; 0.254,-12.954 1.524,-14.224 4.064,-16.764 6.604,-19.304 7.366,-20.066 ; 0.254,-11.684 2.794,-14.224 5.334,-16.764 7.366,-18.796 ; 0.254,-10.414 1.524,-11.684 ; 0.254,-9.144 2.794,-11.684 ; 0.254,-7.874 4.064,-11.684 6.604,-14.224 7.366,-14.986 ; 0.254,-6.604 5.334,-11.684 7.366,-13.716 ; 0.254,-5.334 6.604,-11.684 7.366,-12.446 ; 0.254,-4.064 7.366,-11.176 ; 0.254,-2.794 7.366,-9.906 ; 0.254,-1.524 7.366,-8.636 ; 0.254,-0.254 7.366,-7.366 ; 0.254,1.016 7.366,-6.096 ; 1.016,1.524 7.366,-4.826 ; 2.286,1.524 7.366,-3.556 ; 3.556,1.524 7.366,-2.286 ; 4.826,1.524 7.366,-1.016 ; 6.096,1.524 7.366,0.254 ; 7.366,-17.526 6.604,-16.764 4.064,-14.224 ; 7.366,-16.256 5.334,-14.224 ; 2.794,-11.684 5.334,-14.224 ; 2.794,-11.684 5.334,-14.224 ; 4.064,-14.224 1.27,-11.43 4.064,-14.224 ; 0.254,-21.844 0.254,1.524 7.366,1.524 7.366,-21.844 0.254,-21.844
Info:
  text "'.Comment'" at -0.381,-23.241 h1
3D body: height 2.03, standoff 0.25, extent 0.508,-21.59 7.112,1.27
3D body: height 3, standoff 2, extent 0.508,-21.59 7.112,1.27
3D body: height 0.38, standoff -3, extent 7.493,-0.254 7.747,0.254
3D body: height 2.09, standoff 0.31, extent 7.112,-0.5 7.747,0.5
3D body: height 0.38, standoff -3, extent 7.493,-2.794 7.747,-2.286
3D body: height 2.09, standoff 0.31, extent 7.112,-3.04 7.747,-2.04
3D body: height 0.38, standoff -3, extent -0.127,-2.794 0.127,-2.286
3D body: height 2.09, standoff 0.31, extent -0.127,-3.04 0.508,-2.04
3D body: height 0.38, standoff -3, extent -0.127,-0.254 0.127,0.254
3D body: height 2.09, standoff 0.31, extent -0.127,-0.5 0.508,0.5
3D body: height 0.38, standoff -3, extent 7.493,-5.334 7.747,-4.826
3D body: height 2.09, standoff 0.31, extent 7.112,-5.58 7.747,-4.58
3D body: height 0.38, standoff -3, extent 7.493,-7.874 7.747,-7.366
3D body: height 2.09, standoff 0.31, extent 7.112,-8.12 7.747,-7.12
3D body: height 0.38, standoff -3, extent -0.127,-7.874 0.127,-7.366
3D body: height 2.09, standoff 0.31, extent -0.127,-8.12 0.508,-7.12
3D body: height 0.38, standoff -3, extent -0.127,-5.334 0.127,-4.826
3D body: height 2.09, standoff 0.31, extent -0.127,-5.58 0.508,-4.58
3D body: height 0.38, standoff -3, extent 7.493,-10.414 7.747,-9.906
3D body: height 2.09, standoff 0.31, extent 7.112,-10.66 7.747,-9.66
3D body: height 0.38, standoff -3, extent 7.493,-12.954 7.747,-12.446
3D body: height 2.09, standoff 0.31, extent 7.112,-13.2 7.747,-12.2
3D body: height 0.38, standoff -3, extent -0.127,-12.954 0.127,-12.446
3D body: height 2.09, standoff 0.31, extent -0.127,-13.2 0.508,-12.2
3D body: height 0.38, standoff -3, extent -0.127,-10.414 0.127,-9.906
3D body: height 2.09, standoff 0.31, extent -0.127,-10.66 0.508,-9.66
3D body: height 0.38, standoff -3, extent 7.493,-15.494 7.747,-14.986
3D body: height 2.09, standoff 0.31, extent 7.112,-15.74 7.747,-14.74
3D body: height 0.38, standoff -3, extent 7.493,-18.034 7.747,-17.526
3D body: height 2.09, standoff 0.31, extent 7.112,-18.28 7.747,-17.28
3D body: height 0.38, standoff -3, extent -0.127,-18.034 0.127,-17.526
3D body: height 2.09, standoff 0.31, extent -0.127,-18.28 0.508,-17.28
3D body: height 0.38, standoff -3, extent -0.127,-15.494 0.127,-14.986
3D body: height 2.09, standoff 0.31, extent -0.127,-15.74 0.508,-14.74
3D body: height 0.38, standoff -3, extent 7.493,-20.574 7.747,-20.066
3D body: height 2.09, standoff 0.31, extent 7.112,-20.82 7.747,-19.82
3D body: height 0.38, standoff -3, extent -0.127,-20.574 0.127,-20.066
3D body: height 2.09, standoff 0.31, extent -0.127,-20.82 0.508,-19.82

## DIP20 [mm]
pads (20):
  rect 2.5x1.5 hole 0.8: 1(0,0)
  oval 2.5x1.5 hole 0.8: 2(0,-2.54) 3(0,-5.08) 4(0,-7.62) 5(0,-10.16) 6(0,-12.7) 7(0,-15.24) 8(0,-17.78) 9(0,-20.32) 10(0,-22.86) 11(7.62,-22.86) 12(7.62,-20.32) 13(7.62,-17.78) 14(7.62,-15.24) 15(7.62,-12.7) 16(7.62,-10.16) 17(7.62,-7.62) 18(7.62,-5.08) 19(7.62,-2.54) 20(7.62,0)
Top Overlay:
  lines w0.25: 3.048,1.27 1.524,1.27 1.524,-24.13 6.096,-24.13 6.096,1.27 4.572,1.27 ; 3.092,1.27 ccw(c3.81,1.27) 4.528,1.27
  text "DIP20" at 4.826,-15.875 h2
Draw:
  lines w0.25: 0.254,-23.114 1.524,-24.384 ; 0.254,-21.844 2.794,-24.384 ; 0.254,-20.574 1.524,-21.844 4.064,-24.384 ; 0.254,-19.304 2.794,-21.844 5.334,-24.384 ; 0.254,-18.034 1.524,-19.304 4.064,-21.844 6.604,-24.384 ; 0.254,-16.764 2.794,-19.304 5.334,-21.844 7.366,-23.876 ; 0.254,-15.494 1.524,-16.764 4.064,-19.304 6.604,-21.844 7.366,-22.606 ; 0.254,-14.224 2.794,-16.764 5.334,-19.304 7.366,-21.336 ; 0.254,-12.954 1.524,-14.224 4.064,-16.764 6.604,-19.304 7.366,-20.066 ; 0.254,-11.684 2.794,-14.224 5.334,-16.764 7.366,-18.796 ; 0.254,-10.414 1.524,-11.684 ; 0.254,-9.144 2.794,-11.684 ; 0.254,-7.874 4.064,-11.684 6.604,-14.224 7.366,-14.986 ; 0.254,-6.604 5.334,-11.684 7.366,-13.716 ; 0.254,-5.334 6.604,-11.684 7.366,-12.446 ; 0.254,-4.064 7.366,-11.176 ; 0.254,-2.794 7.366,-9.906 ; 0.254,-1.524 7.366,-8.636 ; 0.254,-0.254 7.366,-7.366 ; 0.254,1.016 7.366,-6.096 ; 1.016,1.524 7.366,-4.826 ; 2.286,1.524 7.366,-3.556 ; 3.556,1.524 7.366,-2.286 ; 4.826,1.524 7.366,-1.016 ; 6.096,1.524 7.366,0.254 ; 7.366,-17.526 6.604,-16.764 4.064,-14.224 ; 7.366,-16.256 5.334,-14.224 ; 2.794,-11.684 5.334,-14.224 ; 2.794,-11.684 5.334,-14.224 ; 4.064,-14.224 1.27,-11.43 4.064,-14.224 ; 0.254,-24.384 7.366,-24.384 7.366,1.524 0.254,1.524 0.254,-24.384
Info:
  text "'.Comment'" at -0.381,-25.781 h1
3D body: height 0.38, standoff -3, extent 7.493,-20.574 7.747,-20.066
3D body: height 2.09, standoff 0.31, extent 7.112,-20.82 7.747,-19.82
3D body: height 0.38, standoff -3, extent 7.493,-23.114 7.747,-22.606
3D body: height 2.09, standoff 0.31, extent 7.112,-23.36 7.747,-22.36
3D body: height 0.38, standoff -3, extent -0.127,-23.114 0.127,-22.606
3D body: height 2.09, standoff 0.31, extent -0.127,-23.36 0.508,-22.36
3D body: height 0.38, standoff -3, extent -0.127,-20.574 0.127,-20.066
3D body: height 2.09, standoff 0.31, extent -0.127,-20.82 0.508,-19.82
3D body: height 0.38, standoff -3, extent 7.493,-10.414 7.747,-9.906
3D body: height 2.09, standoff 0.31, extent 7.112,-10.66 7.747,-9.66
3D body: height 0.38, standoff -3, extent 7.493,-12.954 7.747,-12.446
3D body: height 2.09, standoff 0.31, extent 7.112,-13.2 7.747,-12.2
3D body: height 0.38, standoff -3, extent -0.127,-12.954 0.127,-12.446
3D body: height 2.09, standoff 0.31, extent -0.127,-13.2 0.508,-12.2
3D body: height 0.38, standoff -3, extent -0.127,-10.414 0.127,-9.906
3D body: height 2.09, standoff 0.31, extent -0.127,-10.66 0.508,-9.66
3D body: height 0.38, standoff -3, extent 7.493,-15.494 7.747,-14.986
3D body: height 2.09, standoff 0.31, extent 7.112,-15.74 7.747,-14.74
3D body: height 0.38, standoff -3, extent 7.493,-18.034 7.747,-17.526
3D body: height 2.09, standoff 0.31, extent 7.112,-18.28 7.747,-17.28
3D body: height 0.38, standoff -3, extent -0.127,-18.034 0.127,-17.526
3D body: height 2.09, standoff 0.31, extent -0.127,-18.28 0.508,-17.28
3D body: height 0.38, standoff -3, extent -0.127,-15.494 0.127,-14.986
3D body: height 2.09, standoff 0.31, extent -0.127,-15.74 0.508,-14.74
3D body: height 0.38, standoff -3, extent 7.493,-0.254 7.747,0.254
3D body: height 2.09, standoff 0.31, extent 7.112,-0.5 7.747,0.5
3D body: height 0.38, standoff -3, extent 7.493,-2.794 7.747,-2.286
3D body: height 2.09, standoff 0.31, extent 7.112,-3.04 7.747,-2.04
3D body: height 0.38, standoff -3, extent -0.127,-2.794 0.127,-2.286
3D body: height 2.09, standoff 0.31, extent -0.127,-3.04 0.508,-2.04
3D body: height 0.38, standoff -3, extent -0.127,-0.254 0.127,0.254
3D body: height 2.09, standoff 0.31, extent -0.127,-0.5 0.508,0.5
3D body: height 0.38, standoff -3, extent 7.493,-5.334 7.747,-4.826
3D body: height 2.09, standoff 0.31, extent 7.112,-5.58 7.747,-4.58
3D body: height 0.38, standoff -3, extent 7.493,-7.874 7.747,-7.366
3D body: height 2.09, standoff 0.31, extent 7.112,-8.12 7.747,-7.12
3D body: height 0.38, standoff -3, extent -0.127,-7.874 0.127,-7.366
3D body: height 2.09, standoff 0.31, extent -0.127,-8.12 0.508,-7.12
3D body: height 0.38, standoff -3, extent -0.127,-5.334 0.127,-4.826
3D body: height 2.09, standoff 0.31, extent -0.127,-5.58 0.508,-4.58
3D body: height 2.03, standoff 0.25, extent 0.508,-24.13 7.112,1.27
3D body: height 3, standoff 2, extent 0.508,-24.13 7.112,1.27

## DIP22 [mm]
pads (22):
  rect 2.5x1.5 hole 0.8: 1(0,0)
  oval 2.5x1.5 hole 0.8: 2(0,-2.54) 3(0,-5.08) 4(0,-7.62) 5(0,-10.16) 6(0,-12.7) 7(0,-15.24) 8(0,-17.78) 9(0,-20.32) 10(0,-22.86) 11(0,-25.4) 12(7.62,-25.4) 13(7.62,-22.86) 14(7.62,-20.32) 15(7.62,-17.78) 16(7.62,-15.24) 17(7.62,-12.7) 18(7.62,-10.16) 19(7.62,-7.62) 20(7.62,-5.08) 21(7.62,-2.54) 22(7.62,0)
Top Overlay:
  lines w0.25: 3.048,1.27 1.524,1.27 1.524,-26.67 6.096,-26.67 6.096,1.27 4.572,1.27 ; 3.092,1.27 ccw(c3.81,1.27) 4.528,1.27
  text "DIP22" at 4.826,-17.145 h2
Draw:
  lines w0.25: 0.254,-25.654 1.524,-26.924 ; 0.254,-24.384 2.794,-26.924 ; 0.254,-23.114 1.524,-24.384 4.064,-26.924 ; 0.254,-21.844 2.794,-24.384 5.334,-26.924 ; 0.254,-20.574 1.524,-21.844 4.064,-24.384 6.604,-26.924 ; 0.254,-19.304 2.794,-21.844 5.334,-24.384 7.366,-26.416 ; 0.254,-18.034 1.524,-19.304 4.064,-21.844 6.604,-24.384 7.366,-25.146 ; 0.254,-16.764 2.794,-19.304 5.334,-21.844 7.366,-23.876 ; 0.254,-15.494 1.524,-16.764 4.064,-19.304 6.604,-21.844 7.366,-22.606 ; 0.254,-14.224 2.794,-16.764 5.334,-19.304 7.366,-21.336 ; 0.254,-12.954 1.524,-14.224 4.064,-16.764 6.604,-19.304 7.366,-20.066 ; 0.254,-11.684 2.794,-14.224 5.334,-16.764 7.366,-18.796 ; 0.254,-10.414 1.524,-11.684 ; 0.254,-9.144 2.794,-11.684 ; 0.254,-7.874 4.064,-11.684 6.604,-14.224 7.366,-14.986 ; 0.254,-6.604 5.334,-11.684 7.366,-13.716 ; 0.254,-5.334 6.604,-11.684 7.366,-12.446 ; 0.254,-4.064 7.366,-11.176 ; 0.254,-2.794 7.366,-9.906 ; 0.254,-1.524 7.366,-8.636 ; 0.254,-0.254 7.366,-7.366 ; 0.254,1.016 7.366,-6.096 ; 1.016,1.524 7.366,-4.826 ; 2.286,1.524 7.366,-3.556 ; 3.556,1.524 7.366,-2.286 ; 4.826,1.524 7.366,-1.016 ; 6.096,1.524 7.366,0.254 ; 7.366,-17.526 6.604,-16.764 4.064,-14.224 ; 7.366,-16.256 5.334,-14.224 ; 2.794,-11.684 5.334,-14.224 ; 2.794,-11.684 5.334,-14.224 ; 4.064,-14.224 1.27,-11.43 4.064,-14.224 ; 0.254,-26.924 7.366,-26.924 7.366,1.524 0.254,1.524 0.254,-26.924
Info:
  text "'.Comment'" at -0.381,-28.321 h1
3D body: height 2.03, standoff 0.25, extent 0.508,-26.67 7.112,1.27
3D body: height 3, standoff 2, extent 0.508,-26.67 7.112,1.27
3D body: height 2.09, standoff 0.31, extent -0.127,-5.58 0.508,-4.58
3D body: height 0.38, standoff -3, extent -0.127,-5.334 0.127,-4.826
3D body: height 2.09, standoff 0.31, extent -0.127,-8.12 0.508,-7.12
3D body: height 0.38, standoff -3, extent -0.127,-7.874 0.127,-7.366
3D body: height 2.09, standoff 0.31, extent 7.112,-8.12 7.747,-7.12
3D body: height 0.38, standoff -3, extent 7.493,-7.874 7.747,-7.366
3D body: height 2.09, standoff 0.31, extent 7.112,-5.58 7.747,-4.58
3D body: height 0.38, standoff -3, extent 7.493,-5.334 7.747,-4.826
3D body: height 2.09, standoff 0.31, extent -0.127,-0.5 0.508,0.5
3D body: height 0.38, standoff -3, extent -0.127,-0.254 0.127,0.254
3D body: height 2.09, standoff 0.31, extent -0.127,-3.04 0.508,-2.04
3D body: height 0.38, standoff -3, extent -0.127,-2.794 0.127,-2.286
3D body: height 2.09, standoff 0.31, extent 7.112,-3.04 7.747,-2.04
3D body: height 0.38, standoff -3, extent 7.493,-2.794 7.747,-2.286
3D body: height 2.09, standoff 0.31, extent 7.112,-0.5 7.747,0.5
3D body: height 0.38, standoff -3, extent 7.493,-0.254 7.747,0.254
3D body: height 2.09, standoff 0.31, extent -0.127,-15.74 0.508,-14.74
3D body: height 0.38, standoff -3, extent -0.127,-15.494 0.127,-14.986
3D body: height 2.09, standoff 0.31, extent -0.127,-18.28 0.508,-17.28
3D body: height 0.38, standoff -3, extent -0.127,-18.034 0.127,-17.526
3D body: height 2.09, standoff 0.31, extent 7.112,-18.28 7.747,-17.28
3D body: height 0.38, standoff -3, extent 7.493,-18.034 7.747,-17.526
3D body: height 2.09, standoff 0.31, extent 7.112,-15.74 7.747,-14.74
3D body: height 0.38, standoff -3, extent 7.493,-15.494 7.747,-14.986
3D body: height 2.09, standoff 0.31, extent -0.127,-10.66 0.508,-9.66
3D body: height 0.38, standoff -3, extent -0.127,-10.414 0.127,-9.906
3D body: height 2.09, standoff 0.31, extent -0.127,-13.2 0.508,-12.2
3D body: height 0.38, standoff -3, extent -0.127,-12.954 0.127,-12.446
3D body: height 2.09, standoff 0.31, extent 7.112,-13.2 7.747,-12.2
3D body: height 0.38, standoff -3, extent 7.493,-12.954 7.747,-12.446
3D body: height 2.09, standoff 0.31, extent 7.112,-10.66 7.747,-9.66
3D body: height 0.38, standoff -3, extent 7.493,-10.414 7.747,-9.906
3D body: height 2.09, standoff 0.31, extent -0.127,-25.9 0.508,-24.9
3D body: height 0.38, standoff -3, extent -0.127,-25.654 0.127,-25.146
3D body: height 2.09, standoff 0.31, extent 7.112,-25.9 7.747,-24.9
3D body: height 0.38, standoff -3, extent 7.493,-25.654 7.747,-25.146
3D body: height 2.09, standoff 0.31, extent -0.127,-20.82 0.508,-19.82
3D body: height 0.38, standoff -3, extent -0.127,-20.574 0.127,-20.066
3D body: height 2.09, standoff 0.31, extent -0.127,-23.36 0.508,-22.36
3D body: height 0.38, standoff -3, extent -0.127,-23.114 0.127,-22.606
3D body: height 2.09, standoff 0.31, extent 7.112,-23.36 7.747,-22.36
3D body: height 0.38, standoff -3, extent 7.493,-23.114 7.747,-22.606
3D body: height 2.09, standoff 0.31, extent 7.112,-20.82 7.747,-19.82
3D body: height 0.38, standoff -3, extent 7.493,-20.574 7.747,-20.066